# Altium schematic symbol library NXP_60_26022015.SCHLIB: 1306 symbols (part 24 of 28) (continued)
## PCF2127AT
designator U?, comment Integrated RTC, TCXO and quartz crystal The PCF2127AT is a CMOS2  Real Time Clock (RTC) and calendar with an integrated Temperature Compensated Crystal (Xtal) Oscillator (TCXO) and a 32.768 kHz quartz crystal optimized for very high accuracy and very low power consumption. The PCF2127AT has 512 bytes of general purpose static RAM, a selectable I2C-bus or SPI-bus, a backup battery switch-over circuit, a programmable watchdog function, a timestamp function, and many other features.    AAL Eindhoven MK
footprint SOT163-1
pins: 1 SCL, 2 SDO (out), 3 SDI, 4 SDA/!CE, 5 IFS, 6 !TS!, 7 CLKOUT (out), 8 VSS (power), 13 TEST, 14 !PFO (out), 15 PFI, 16 !RST, 17 !INT1! (out), 18 BSS (out), 19 VBAT (power), 20 VDD (power)

## PCF2129AT
designator U?, comment Accurate RTC with integrated quartz crystal for industrial The PCF2129T is a CMOS1  Real Time Clock (RTC) and calendar with an integrated Temperature Compensated Crystal (Xtal) Oscillator (TCXO) and a 32.768 kHz quartz crystal optimized for very high accuracy and very low power consumption. The PCF2129T has a selectable I2C-bus or SPI-bus, a backup battery switch-over circuit, a programmable watchdog function, a timestamp function, and many other features.    AAL Eindhoven MK
TEMPERATURE_RANGE: -15 °C to +60 °C
footprint SOT163-1
pins: 1 SCL, 2 SDI, 3 SDO (out), 4 SDA/!CE, 5 IFS, 6 !TS!, 7 CLKOUT (out), 8 VSS (power), 17 !INT1! (out), 18 BSS (out), 19 VBAT (power), 20 VDD (power)

## PCF2129T
designator U?, comment Accurate RTC with integrated quartz crystal for industrial The PCF2129T is a CMOS1  Real Time Clock (RTC) and calendar with an integrated Temperature Compensated Crystal (Xtal) Oscillator (TCXO) and a 32.768 kHz quartz crystal optimized for very high accuracy and very low power consumption. The PCF2129T has a selectable I2C-bus or SPI-bus, a backup battery switch-over circuit, a programmable watchdog function, a timestamp function, and many other features.    AAL Eindhoven MK
TEMPERATURE_RANGE: -15 °C to +60 °C
footprint SOT162-1
pins: 1 SCL, 2 SDI, 3 SDO (out), 4 SDA/!CE, 5 IFS, 6 !TS!, 7 CLKOUT (out), 8 VSS (power), 13 !INT1! (out), 14 BSS (out), 15 VBAT (power), 16 VDD (power)

## PCF8523T
designator U?, comment The PCF8523 is a CMOS Real-Time Clock (RTC) and calendar optimized for low power consumption. Data is transferred serially via an I2C-bus with a maximum data rate of 1000 kbit/s. Alarm and timer functions are available with the possibility to generate a wake-up signal on an interrupt pin. An offset register allows fine-tuning of the clock. The PCF8523 has a backup battery switch-over circuit, which detects power failures and automatically switches to the battery supply when a power failure occurs.   AAL Eindhoven MK
footprint SOT96-1
pins: 1 OSCI, 2 OSCO, 3 VBAT (power), 4 VSS (power), 5 SDA, 6 SCL, 7 !INT1 (out), 8 VDD (power)

## PCF8523TK
designator U?, comment The PCF8523 is a CMOS Real-Time Clock (RTC) and calendar optimized for low power consumption. Data is transferred serially via an I2C-bus with a maximum data rate of 1000 kbit/s. Alarm and timer functions are available with the possibility to generate a wake-up signal on an interrupt pin. An offset register allows fine-tuning of the clock. The PCF8523 has a backup battery switch-over circuit, which detects power failures and automatically switches to the battery supply when a power failure occurs.   AAL Eindhoven MK
footprint SOT909-1
pins: 1 OSCI, 2 OSCO, 3 VBAT (power), 4 VSS (power), 5 SDA, 6 SCL, 7 !INT1 (out), 8 VDD (power)

## PCF8523TS
designator ?, comment The PCF8523 is a CMOS Real-Time Clock (RTC) and calendar optimized for low power consumption. Data is transferred serially via an I2C-bus with a maximum data rate of 1000 kbit/s. Alarm and timer functions are available with the possibility to generate a wake-up signal on an interrupt pin. An offset register allows fine-tuning of the clock. The PCF8523 has a backup battery switch-over circuit, which detects power failures and automatically switches to the battery supply when a power failure occurs.   AAL Eindhoven MK
footprint SOT402-1
pins: 1 OSCI, 2 OSCO, 4 VBAT (power), 5 VSS (power), 7 !INT2 (out), 8 CLKOUT (out), 10 SDA, 11 SCL, 12 VDD (power), 13 !INT1 (out)

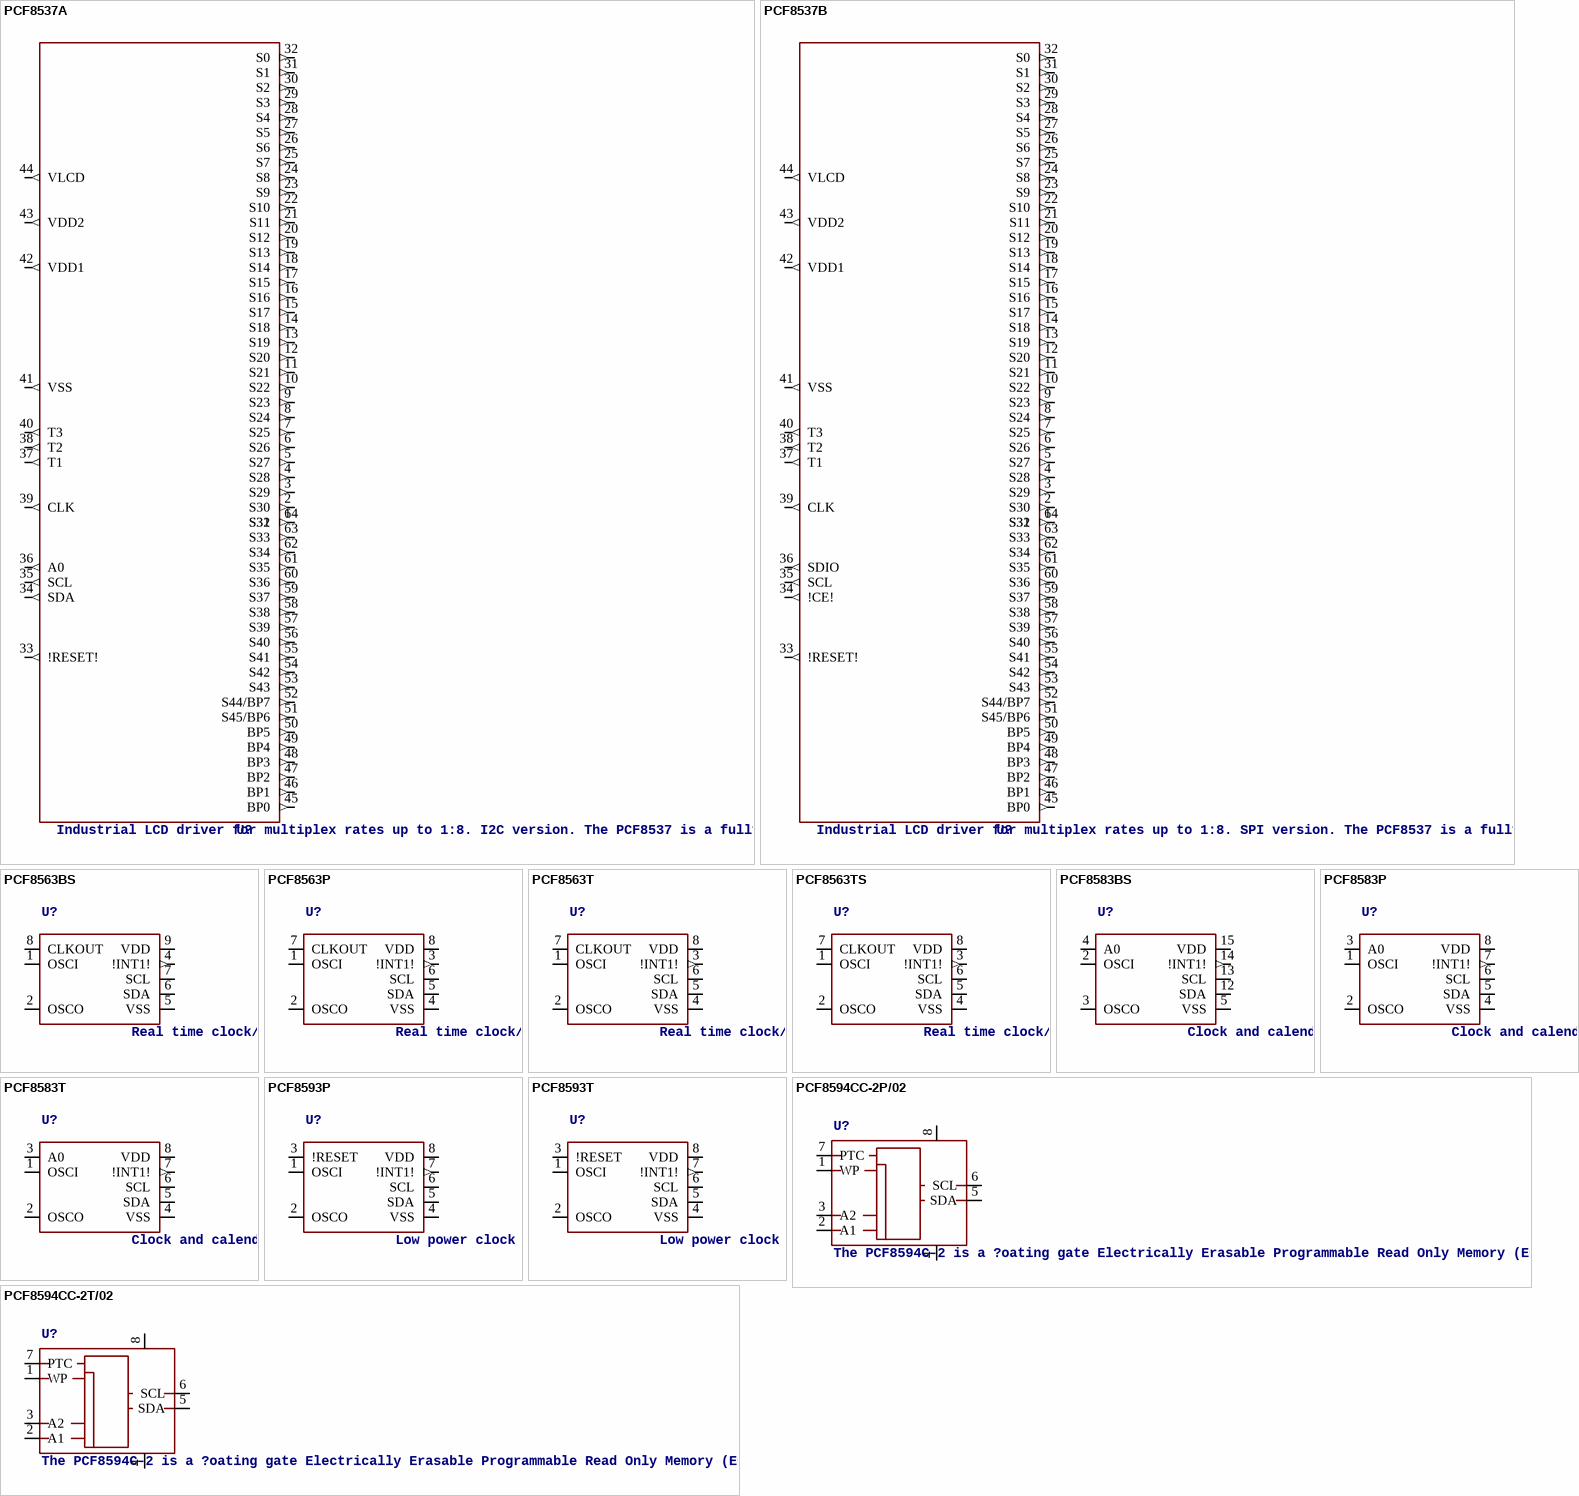
[diagram p164: symbols PCF8537A to PCF8594CC-2T/02]

## PCF8537A
designator U?, comment Industrial LCD driver for multiplex rates up to 1:8. I2C version. The PCF8537 is a fully featured Liquid Crystal Display (LCD) driver, specifically designed for high-contrast Vertical Alignment (VA) LCD with multiplex rates up to 1:8. It generates the drive signals for any static or multiplexed LCD containing up to eight backplanes, 46 segments, and up to 352 elements. The PCF8537 features an internal charge pump with internal capacitors for on-chip generation of the LCD driving voltage. To ensure an optimal and stable contrast over the full temperature range, the PCF8537 offers a programmable temperature compensation of the LCD supply voltage. The PCF8537 can be easily connected to a microcontroller by either the two-line I2C-bus (PCF8537AH) or a three-line bidirectional SPI-bus (PCF8537BH). AAL Eindhoven MK
footprint SOT357-1
pins: 1 S31 (out), 2 S30 (out), 3 S29 (out), 4 S28 (out), 5 S27 (out), 6 S26 (out), 7 S25 (out), 8 S24 (out), 9 S23 (out), 10 S22 (out), 11 S21 (out), 12 S20 (out), 13 S19 (out), 14 S18 (out), 15 S17 (out), 16 S16 (out), 17 S15 (out), 18 S14 (out), 19 S13 (out), 20 S12 (out), 21 S11 (out), 22 S10 (out), 23 S9 (out), 24 S8 (out), 25 S7 (out), 26 S6 (out), 27 S5 (out), 28 S4 (out), 29 S3 (out), 30 S2 (out), 31 S1 (out), 32 S0 (out), 33 !RESET! (out), 34 SDA (out), 35 SCL (out), 36 A0 (out), 37 T1 (out), 38 T2 (out), 39 CLK (out), 40 T3 (out), 41 VSS (out), 42 VDD1 (out), 43 VDD2 (out), 44 VLCD (out), 45 BP0 (out), 46 BP1 (out), 47 BP2 (out), 48 BP3 (out), 49 BP4 (out), 50 BP5 (out), 51 S45/BP6 (out), 52 S44/BP7 (out), 53 S43 (out), 54 S42 (out), 55 S41 (out), 56 S40 (out), 57 S39 (out), 58 S38 (out), 59 S37 (out), 60 S36 (out), 61 S35 (out), 62 S34 (out), 63 S33 (out), 64 S32 (out)

## PCF8537B
designator U?, comment Industrial LCD driver for multiplex rates up to 1:8. SPI version. The PCF8537 is a fully featured Liquid Crystal Display (LCD) driver, specifically designed for high-contrast Vertical Alignment (VA) LCD with multiplex rates up to 1:8. It generates the drive signals for any static or multiplexed LCD containing up to eight backplanes, 46 segments, and up to 352 elements. The PCF8537 features an internal charge pump with internal capacitors for on-chip generation of the LCD driving voltage. To ensure an optimal and stable contrast over the full temperature range, the PCF8537 offers a programmable temperature compensation of the LCD supply voltage. The PCF8537 can be easily connected to a microcontroller by either the two-line I2C-bus (PCF8537AH) or a three-line bidirectional SPI-bus (PCF8537BH).    AAL Eindhoven MK
footprint SOT357-1
pins: 1 S31 (out), 2 S30 (out), 3 S29 (out), 4 S28 (out), 5 S27 (out), 6 S26 (out), 7 S25 (out), 8 S24 (out), 9 S23 (out), 10 S22 (out), 11 S21 (out), 12 S20 (out), 13 S19 (out), 14 S18 (out), 15 S17 (out), 16 S16 (out), 17 S15 (out), 18 S14 (out), 19 S13 (out), 20 S12 (out), 21 S11 (out), 22 S10 (out), 23 S9 (out), 24 S8 (out), 25 S7 (out), 26 S6 (out), 27 S5 (out), 28 S4 (out), 29 S3 (out), 30 S2 (out), 31 S1 (out), 32 S0 (out), 33 !RESET! (out), 34 !CE! (out), 35 SCL (out), 36 SDIO (out), 37 T1 (out), 38 T2 (out), 39 CLK (out), 40 T3 (out), 41 VSS (out), 42 VDD1 (out), 43 VDD2 (out), 44 VLCD (out), 45 BP0 (out), 46 BP1 (out), 47 BP2 (out), 48 BP3 (out), 49 BP4 (out), 50 BP5 (out), 51 S45/BP6 (out), 52 S44/BP7 (out), 53 S43 (out), 54 S42 (out), 55 S41 (out), 56 S40 (out), 57 S39 (out), 58 S38 (out), 59 S37 (out), 60 S36 (out), 61 S35 (out), 62 S34 (out), 63 S33 (out), 64 S32 (out)

## PCF8563BS
designator U?, comment Real time clock/calendar The PCF8563 is a CMOS Real-Time Clock (RTC) and calendar optimized for low power consumption. A programmable clock output, interrupt output, and voltage-low detector are also provided. All addresses and data are transferred serially via a two-line bidirectional I2C-bus. Maximum bus speed is 400 kbit/s. The register address is incremented automatically after each written or read data byte.    AAL Eindhoven MK
footprint SOT650
pins: 1 OSCI, 2 OSCO, 4 !INT1! (out), 5 VSS (power), 6 SDA, 7 SCL, 8 CLKOUT (power), 9 VDD (power)

## PCF8563P
designator U?, comment Real time clock/calendar The PCF8563 is a CMOS Real-Time Clock (RTC) and calendar optimized for low power consumption. A programmable clock output, interrupt output, and voltage-low detector are also provided. All addresses and data are transferred serially via a two-line bidirectional I2C-bus. Maximum bus speed is 400 kbit/s. The register address is incremented automatically after each written or read data byte.    AAL Eindhoven MK
footprint SOT97-1
pins: 1 OSCI, 2 OSCO, 3 !INT1! (out), 4 VSS (power), 5 SDA, 6 SCL, 7 CLKOUT (power), 8 VDD (power)

## PCF8563T
designator U?, comment Real time clock/calendar The PCF8563 is a CMOS Real-Time Clock (RTC) and calendar optimized for low power consumption. A programmable clock output, interrupt output, and voltage-low detector are also provided. All addresses and data are transferred serially via a two-line bidirectional I2C-bus. Maximum bus speed is 400 kbit/s. The register address is incremented automatically after each written or read data byte.    AAL Eindhoven MK
footprint SOT96-1
pins: 1 OSCI, 2 OSCO, 3 !INT1! (out), 4 VSS (power), 5 SDA, 6 SCL, 7 CLKOUT (power), 8 VDD (power)

## PCF8563TS
designator U?, comment Real time clock/calendar The PCF8563 is a CMOS Real-Time Clock (RTC) and calendar optimized for low power consumption. A programmable clock output, interrupt output, and voltage-low detector are also provided. All addresses and data are transferred serially via a two-line bidirectional I2C-bus. Maximum bus speed is 400 kbit/s. The register address is incremented automatically after each written or read data byte.    AAL Eindhoven MK
footprint SOT505-1
pins: 1 OSCI, 2 OSCO, 3 !INT1! (out), 4 VSS (power), 5 SDA, 6 SCL, 7 CLKOUT (power), 8 VDD (power)

## PCF8583BS
designator U?, comment Clock and calendar with 240 x 8-bit RAM The PCF8583 is a clock and calendar chip, based on a 2048 bit static CMOS  RAM organized as 256 words by 8 bits. Addresses and data are transferred serially via the two-line bidirectional I2C-bus. The built-in word address register is incremented automatically after each written or read data byte. Address pin A0 is used for programming the hardware address, allowing the connection of two devices to the bus without additional hardware. The built-in 32.768 kHz oscillator circuit and the first 8 bytes of the RAM are used for the clock, calendar, and counter functions. The next 8 bytes can be programmed as alarm registers or used as free RAM space. The remaining 240 bytes are free RAM locations.    AAL Eindhoven MK
footprint SOT662-1
pins: 2 OSCI, 3 OSCO, 4 A0 (power), 5 VSS (power), 12 SDA, 13 SCL, 14 !INT1! (out), 15 VDD (power)

## PCF8583P
designator U?, comment Clock and calendar with 240 x 8-bit RAM The PCF8583 is a clock and calendar chip, based on a 2048 bit static CMOS  RAM organized as 256 words by 8 bits. Addresses and data are transferred serially via the two-line bidirectional I2C-bus. The built-in word address register is incremented automatically after each written or read data byte. Address pin A0 is used for programming the hardware address, allowing the connection of two devices to the bus without additional hardware. The built-in 32.768 kHz oscillator circuit and the first 8 bytes of the RAM are used for the clock, calendar, and counter functions. The next 8 bytes can be programmed as alarm registers or used as free RAM space. The remaining 240 bytes are free RAM locations.    AAL Eindhoven MK
footprint SOT97-1
pins: 1 OSCI, 2 OSCO, 3 A0 (power), 4 VSS (power), 5 SDA, 6 SCL, 7 !INT1! (out), 8 VDD (power)

## PCF8583T
designator U?, comment Clock and calendar with 240 x 8-bit RAM The PCF8583 is a clock and calendar chip, based on a 2048 bit static CMOS  RAM organized as 256 words by 8 bits. Addresses and data are transferred serially via the two-line bidirectional I2C-bus. The built-in word address register is incremented automatically after each written or read data byte. Address pin A0 is used for programming the hardware address, allowing the connection of two devices to the bus without additional hardware. The built-in 32.768 kHz oscillator circuit and the first 8 bytes of the RAM are used for the clock, calendar, and counter functions. The next 8 bytes can be programmed as alarm registers or used as free RAM space. The remaining 240 bytes are free RAM locations.    AAL Eindhoven MK
footprint SOT176-1
pins: 1 OSCI, 2 OSCO, 3 A0 (power), 4 VSS (power), 5 SDA, 6 SCL, 7 !INT1! (out), 8 VDD (power)

## PCF8593P
designator U?, comment Low power clock and calendar The PCF8593 is a CMOS clock and calendar circuit, optimized for low power consumption. Addresses and data are transferred serially via the two-line bidirectional I2C-bus. The built-in word address register is incremented automatically after each written or read data byte. The built-in 32.768 kHz oscillator circuit and the first 8 bytes of the RAM are used for the clock, calendar, and counter functions. The next 8 bytes can be programmed as alarm registers or used as free RAM space.    AAL Eindhoven MK
footprint SOT97-1
pins: 1 OSCI, 2 OSCO, 3 !RESET, 4 VSS (power), 5 SDA, 6 SCL, 7 !INT1! (out), 8 VDD (power)

## PCF8593T
designator U?, comment Low power clock and calendar The PCF8593 is a CMOS clock and calendar circuit, optimized for low power consumption. Addresses and data are transferred serially via the two-line bidirectional I2C-bus. The built-in word address register is incremented automatically after each written or read data byte. The built-in 32.768 kHz oscillator circuit and the first 8 bytes of the RAM are used for the clock, calendar, and counter functions. The next 8 bytes can be programmed as alarm registers or used as free RAM space.    AAL Eindhoven MK
footprint SOT96-1
pins: 1 OSCI, 2 OSCO, 3 !RESET, 4 VSS (power), 5 SDA, 6 SCL, 7 !INT1! (out), 8 VDD (power)

## PCF8594CC-2P/02
designator U?, comment The PCF8594C-2 is a ?oating gate Electrically Erasable Programmable Read Only Memory (EEPROM) with 4 kbits (512 × 8-bit) non-volatile storage.    AAL Eindhoven MK
footprint SOT97-1
pins: 1 WP, 2 A1, 3 A2, 4 GND (power), 5 SDA, 6 SCL, 7 PTC, 8 VCC (power)

## PCF8594CC-2T/02
designator U?, comment The PCF8594C-2 is a ?oating gate Electrically Erasable Programmable Read Only Memory (EEPROM) with 4 kbits (512 × 8-bit) non-volatile storage.    AAL Eindhoven MK
SAMPLEDESK: 12NC935195550118
footprint SOT96-1
pins: 1 WP, 2 A1, 3 A2, 4 GND (power), 5 SDA, 6 SCL, 7 PTC, 8 VCC (power)

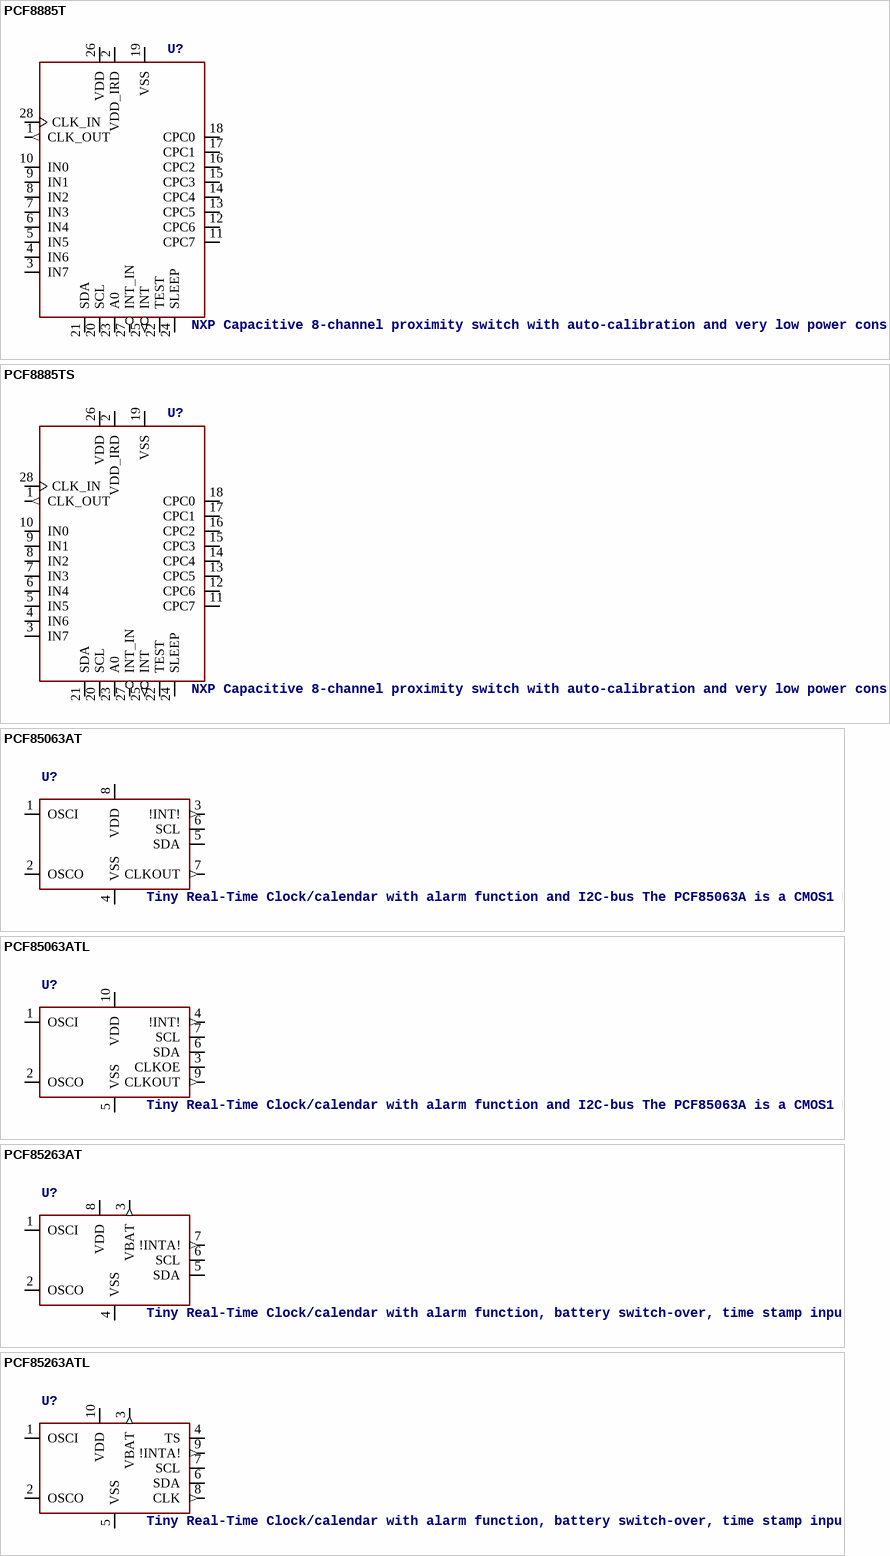
[diagram p165: symbols PCF8885T to PCF85263ATL]

## PCF8885T
designator U?, comment NXP Capacitive 8-channel proximity switch with auto-calibration and very low power consumption   AAL Eindhoven MK
footprint SOT136-1
pins: 1 CLK_OUT (out), 2 VDD_IRD (power), 3 IN7, 4 IN6, 5 IN5, 6 IN4, 7 IN3, 8 IN2, 9 IN1, 10 IN0, 11 CPC7, 12 CPC6, 13 CPC5, 14 CPC4, 15 CPC3, 16 CPC2, 17 CPC1, 18 CPC0, 19 VSS (power), 20 SCL, 21 SDA, 22 TEST, 23 A0, 24 SLEEP, 25 INT (out), 26 VDD (power), 27 INT_IN, 28 CLK_IN

## PCF8885TS
designator U?, comment NXP Capacitive 8-channel proximity switch with auto-calibration and very low power consumption   AAL Eindhoven MK
footprint SOT361-1
pins: 1 CLK_OUT (out), 2 VDD_IRD (power), 3 IN7, 4 IN6, 5 IN5, 6 IN4, 7 IN3, 8 IN2, 9 IN1, 10 IN0, 11 CPC7, 12 CPC6, 13 CPC5, 14 CPC4, 15 CPC3, 16 CPC2, 17 CPC1, 18 CPC0, 19 VSS (power), 20 SCL, 21 SDA, 22 TEST, 23 A0, 24 SLEEP, 25 INT (out), 26 VDD (power), 27 INT_IN, 28 CLK_IN

## PCF85063AT
designator U?, comment Tiny Real-Time Clock/calendar with alarm function and I2C-bus The PCF85063A is a CMOS1 Real-Time Clock (RTC) and calendar optimized for low power consumption. An offset register allows fine-tuning of the clock. All addresses and data are transferred serially via the two-line bidirectional I2C-bus. Maximum data rate is 400 kbit/s. The register address is incremented automatically after each written or read data byte.    AAL Eindhoven MK
footprint SOT96-1
pins: 1 OSCI, 2 OSCO, 3 !INT! (out), 4 VSS (power), 5 SDA, 6 SCL, 7 CLKOUT (out), 8 VDD (power)

## PCF85063ATL
designator U?, comment Tiny Real-Time Clock/calendar with alarm function and I2C-bus The PCF85063A is a CMOS1 Real-Time Clock (RTC) and calendar optimized for low power consumption. An offset register allows fine-tuning of the clock. All addresses and data are transferred serially via the two-line bidirectional I2C-bus. Maximum data rate is 400 kbit/s. The register address is incremented automatically after each written or read data byte.    AAL Eindhoven MK
footprint SOT1197-1
pins: 1 OSCI, 2 OSCO, 3 CLKOE, 4 !INT! (out), 5 VSS (power), 6 SDA, 7 SCL, 9 CLKOUT (out), 10 VDD (power)

## PCF85263AT
designator U?, comment Tiny Real-Time Clock/calendar with alarm function, battery switch-over, time stamp input, and I2C-bus The PCF85263A is a CMOS1 Real-Time Clock (RTC) and calendar optimized for low power consumption and with automatic switching to battery on main power loss. The RTC can also be configured as a stop-watch (elapsed time counter). Three time log registers triggered from battery switch-over as well as input driven events. Featuring clock output and two independent interrupt signals, two alarms, I2C interface and quartz crystal calibration.    AAL Eindhoven MK
footprint SOT96-1
pins: 1 OSCI, 2 OSCO, 3 VBAT (out), 4 VSS (power), 5 SDA, 6 SCL, 7 !INTA! (out), 8 VDD (power)

## PCF85263ATL
designator U?, comment Tiny Real-Time Clock/calendar with alarm function, battery switch-over, time stamp input, and I2C-bus The PCF85263A is a CMOS1 Real-Time Clock (RTC) and calendar optimized for low power consumption and with automatic switching to battery on main power loss. The RTC can also be configured as a stop-watch (elapsed time counter). Three time log registers triggered from battery switch-over as well as input driven events. Featuring clock output and two independent interrupt signals, two alarms, I2C interface and quartz crystal calibration.    AAL Eindhoven MK
footprint SOT1197-1
pins: 1 OSCI, 2 OSCO, 3 VBAT (out), 4 TS, 5 VSS (power), 6 SDA, 7 SCL, 8 CLK (out), 9 !INTA! (out), 10 VDD (power)

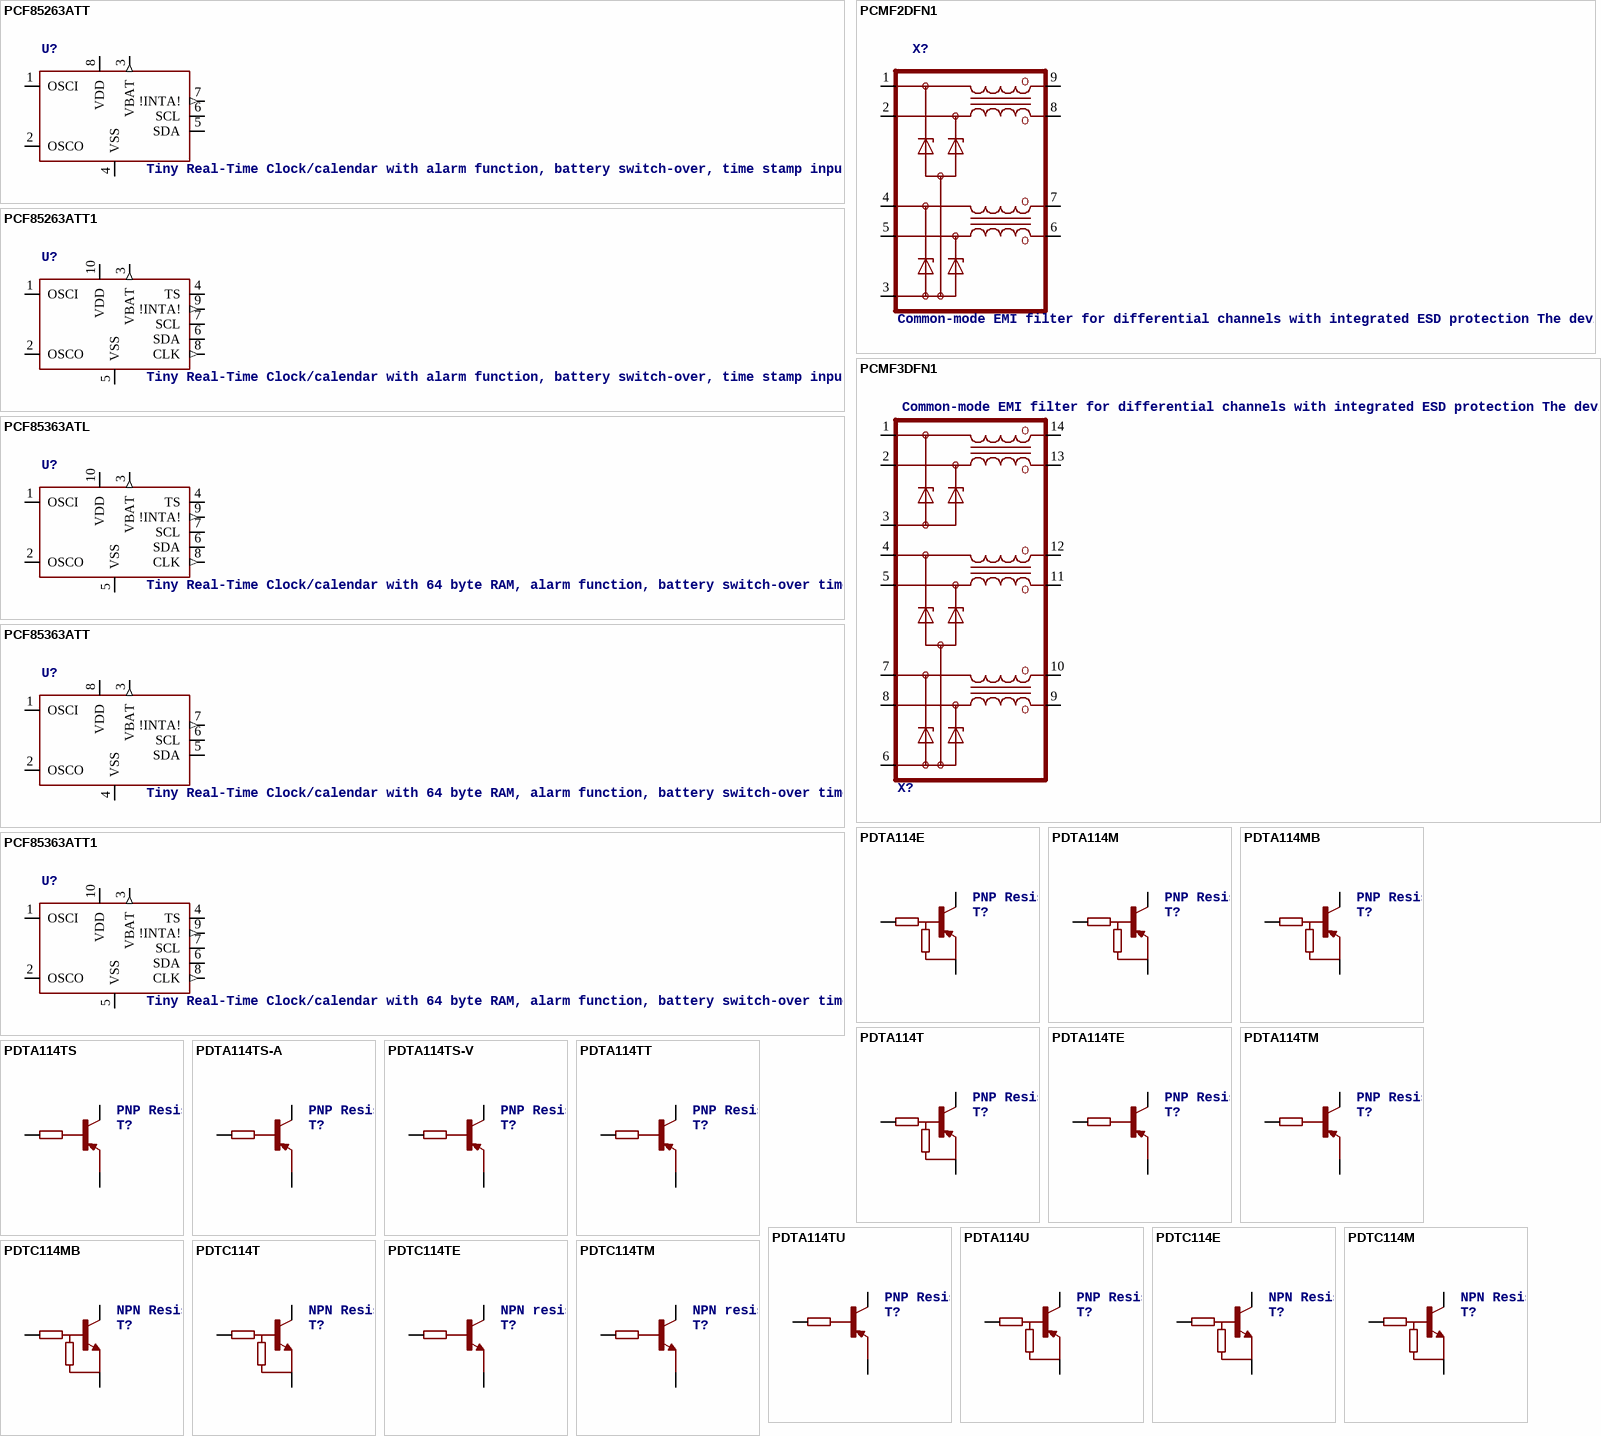
[diagram p166: symbols PCF85263ATT to PDTC114TM]

## PCF85263ATT
designator U?, comment Tiny Real-Time Clock/calendar with alarm function, battery switch-over, time stamp input, and I2C-bus The PCF85263A is a CMOS1 Real-Time Clock (RTC) and calendar optimized for low power consumption and with automatic switching to battery on main power loss. The RTC can also be configured as a stop-watch (elapsed time counter). Three time log registers triggered from battery switch-over as well as input driven events. Featuring clock output and two independent interrupt signals, two alarms, I2C interface and quartz crystal calibration.    AAL Eindhoven MK
footprint SOT505-1
pins: 1 OSCI, 2 OSCO, 3 VBAT (out), 4 VSS (power), 5 SDA, 6 SCL, 7 !INTA! (out), 8 VDD (power)

## PCF85263ATT1
designator U?, comment Tiny Real-Time Clock/calendar with alarm function, battery switch-over, time stamp input, and I2C-bus The PCF85263A is a CMOS1 Real-Time Clock (RTC) and calendar optimized for low power consumption and with automatic switching to battery on main power loss. The RTC can also be configured as a stop-watch (elapsed time counter). Three time log registers triggered from battery switch-over as well as input driven events. Featuring clock output and two independent interrupt signals, two alarms, I2C interface and quartz crystal calibration.    AAL Eindhoven MK
footprint SOT552-1
pins: 1 OSCI, 2 OSCO, 3 VBAT (out), 4 TS, 5 VSS (power), 6 SDA, 7 SCL, 8 CLK (out), 9 !INTA! (out), 10 VDD (power)

## PCF85363ATL
designator U?, comment Tiny Real-Time Clock/calendar with 64 byte RAM, alarm function, battery switch-over time stamp input, and I2C-buss The PCF85363A is a CMOS1 Real-Time Clock (RTC) and calendar optimized for low power consumption and with automatic switching to battery on main power loss. The RTC can also be configured as a stop-watch (elapsed time counter). Three time log registers triggered from battery switch-over as well as input driven events. Featuring clock output and two independent interrupt signals, two alarms, I2C interface and quartz crystal calibration, 64 byte battery backed-up RAM.    AAL Eindhoven MK
footprint SOT1197-1
pins: 1 OSCI, 2 OSCO, 3 VBAT (out), 4 TS, 5 VSS (power), 6 SDA, 7 SCL, 8 CLK (out), 9 !INTA! (out), 10 VDD (power)

## PCF85363ATT
designator U?, comment Tiny Real-Time Clock/calendar with 64 byte RAM, alarm function, battery switch-over time stamp input, and I2C-bus The PCF85363A is a CMOS1 Real-Time Clock (RTC) and calendar optimized for low power consumption and with automatic switching to battery on main power loss. The RTC can also be configured as a stop-watch (elapsed time counter). Three time log registers triggered from battery switch-over as well as input driven events. Featuring clock output and two independent interrupt signals, two alarms, I2C interface and quartz crystal calibration, 64 byte battery backed-up RAM.    AAL Eindhoven MK
footprint SOT505-1
pins: 1 OSCI, 2 OSCO, 3 VBAT (out), 4 VSS (power), 5 SDA, 6 SCL, 7 !INTA! (out), 8 VDD (power)

## PCF85363ATT1
designator U?, comment Tiny Real-Time Clock/calendar with 64 byte RAM, alarm function, battery switch-over time stamp input, and I2C-buss The PCF85363A is a CMOS1 Real-Time Clock (RTC) and calendar optimized for low power consumption and with automatic switching to battery on main power loss. The RTC can also be configured as a stop-watch (elapsed time counter). Three time log registers triggered from battery switch-over as well as input driven events. Featuring clock output and two independent interrupt signals, two alarms, I2C interface and quartz crystal calibration, 64 byte battery backed-up RAM.    AAL Eindhoven MK
footprint SOT552-1
pins: 1 OSCI, 2 OSCO, 3 VBAT (out), 4 TS, 5 VSS (power), 6 SDA, 7 SCL, 8 CLK (out), 9 !INTA! (out), 10 VDD (power)

## PCMF2DFN1
designator X?, comment Common-mode EMI filter for differential channels with integrated ESD protection The devices are common-mode ElectroMagnetic Interference (EMI) filters with integrated ElectroStatic Discharge (ESD) protection for two and three differential channels. The devices are designed to provide low insertion loss for differential high-speed signals on each channel while unwanted common-mode signals are attenuated. Each differential channel incorporates two signal lines that are coupled by integrated coils. Diodes provide protection to downstream components from ESD voltages up to 15 kV on each signal line.    AAL Eindhoven MK
footprint SOT1333-1
pins: 1, 2, 3 (power), 4, 5, 6, 7, 8, 9

## PCMF3DFN1
designator X?, comment Common-mode EMI filter for differential channels with integrated ESD protection The devices are common-mode ElectroMagnetic Interference (EMI) filters with integrated ElectroStatic Discharge (ESD) protection for two and three differential channels. The devices are designed to provide low insertion loss for differential high-speed signals on each channel while unwanted common-mode signals are attenuated. Each differential channel incorporates two signal lines that are coupled by integrated coils. Diodes provide protection to downstream components from ESD voltages up to 15 kV on each signal line.    AAL Eindhoven MK
footprint SOT1334-1
pins: 1, 2, 3, 4, 5, 6 (power), 7, 8, 9, 10, 11, 12, 13, 14

## PDTA114E
designator T?, comment PNP Resistor-Equipped Transistor (RET) family in small Surface-Mounted Device (SMD) plastic packages.   AAL Eindhoven MK
footprint SOT416
pins: 1 INPUT, 2 E, 3 C

## PDTA114M
designator T?, comment PNP Resistor-Equipped Transistor (RET) family in small Surface-Mounted Device (SMD) plastic packages.   AAL Eindhoven MK
footprint SOT883(B)
pins: 1 INPUT, 2 E, 3 C

## PDTA114MB
designator T?, comment PNP Resistor-Equipped Transistor (RET) family in small Surface-Mounted Device (SMD) plastic packages.   AAL Eindhoven MK
footprint SOT883(B)
pins: 1 INPUT, 2 E, 3 C

## PDTA114T
designator T?, comment PNP Resistor-Equipped Transistor (RET) family in small Surface-Mounted Device (SMD) plastic packages.   AAL Eindhoven MK
footprint SOT23
pins: 1 INPUT, 2 E, 3 C

## PDTA114TE
designator T?, comment PNP Resistor-Equipped Transistor (RET) family in small Surface-Mounted Device (SMD) plastic packages.   AAL Eindhoven MK
footprint SOT416
pins: 1 INPUT, 2 E, 3 C

## PDTA114TM
designator T?, comment PNP Resistor-Equipped Transistor (RET) family in small Surface-Mounted Device (SMD) plastic packages.   AAL Eindhoven MK
footprint SOT883(B)
pins: 1 INPUT, 2 E, 3 C

## PDTA114TS
designator T?, comment PNP Resistor-Equipped Transistor (RET) family in small Surface-Mounted Device (SMD) plastic packages.   AAL Eindhoven MK
footprint SOT54
pins: 1 INPUT, 2 C, 3 E

## PDTA114TS-A
designator T?, comment PNP Resistor-Equipped Transistor (RET) family in small Surface-Mounted Device (SMD) plastic packages.   AAL Eindhoven MK
footprint SOT54A
pins: 1 INPUT, 2 C, 3 E

## PDTA114TS-V
designator T?, comment PNP Resistor-Equipped Transistor (RET) family in small Surface-Mounted Device (SMD) plastic packages.   AAL Eindhoven MK
footprint SOT54V
pins: 1 INPUT, 2 C, 3 E